# Altium footprint library SparkFun.PCBLIB: 674 footprints (part 40 of 44)
Each footprint in its own frame and in the unit in brackets; x right, y up, seen from the top. Pads: shape width x height; smd on the part's side, far side on the other; paste and mask are expansions set on the pad; w line width, h text height; cw(c..) or ccw(c..) is an arc to the next point about the centre after c.
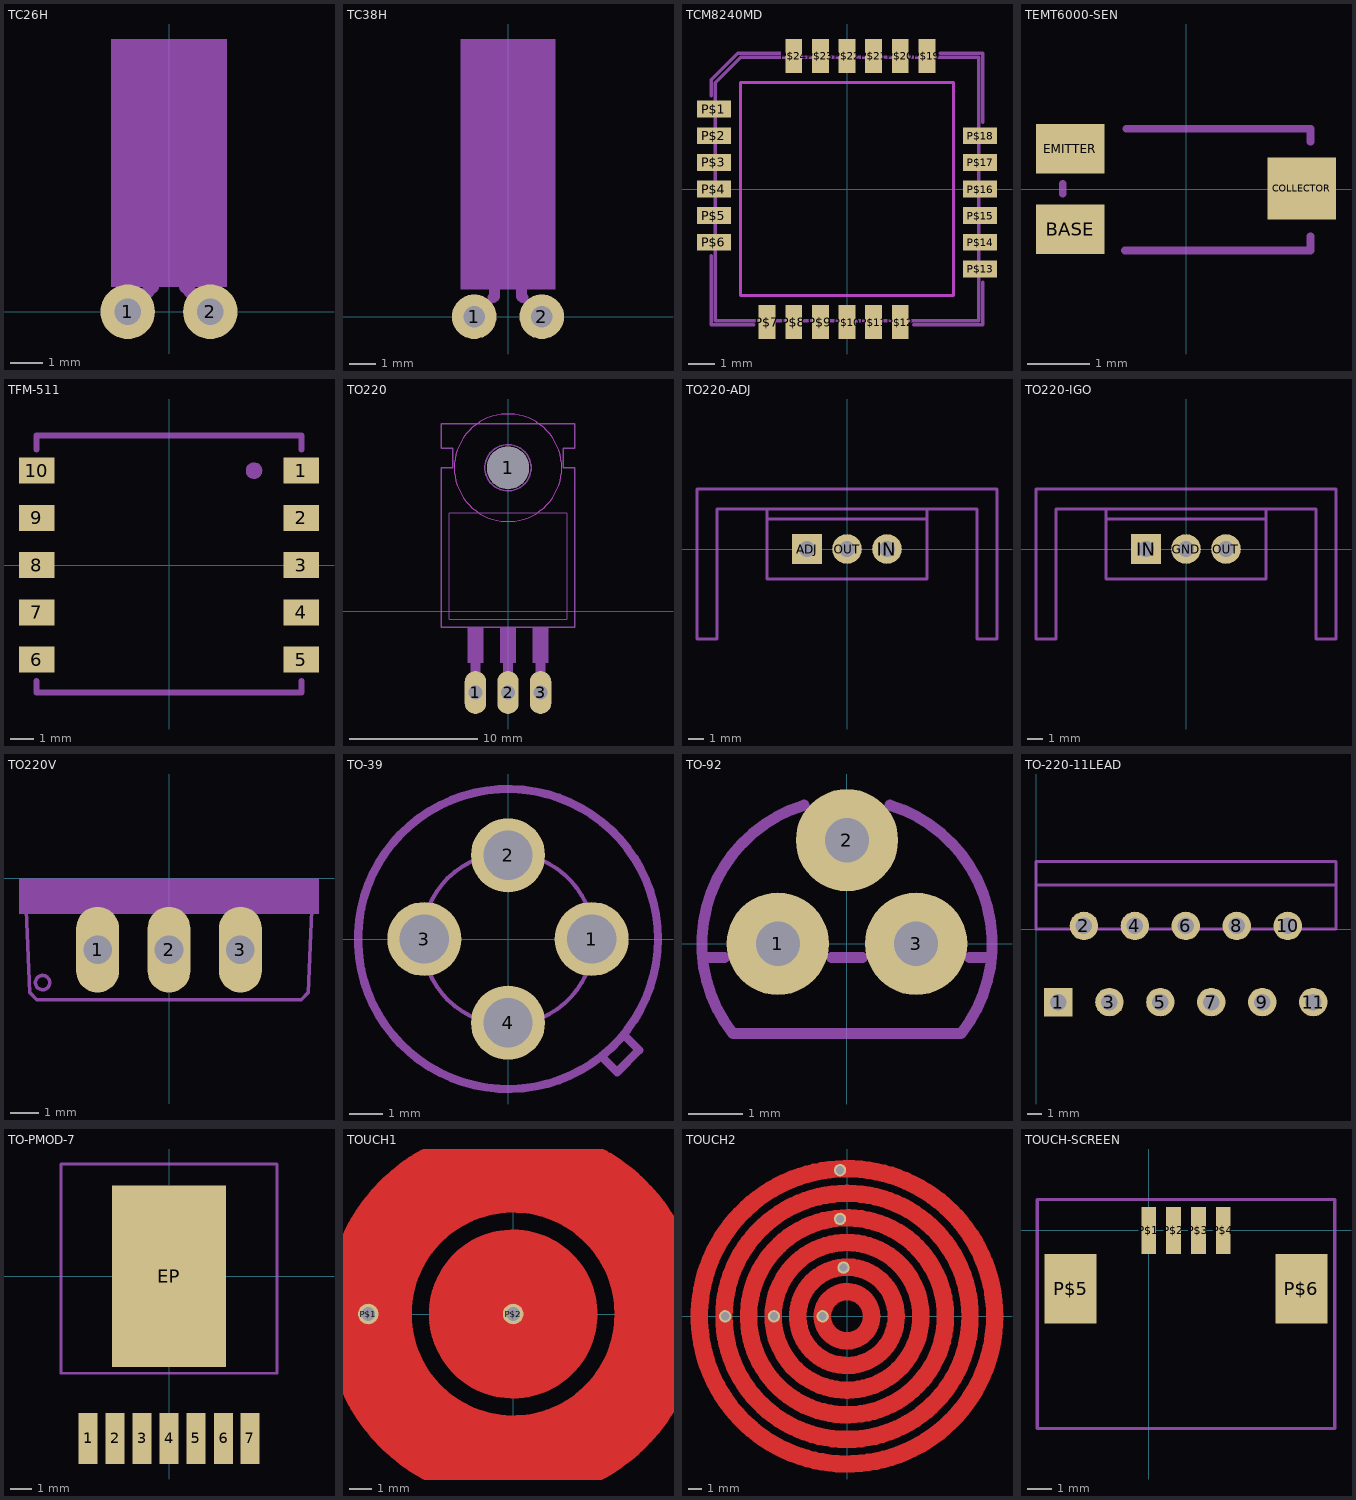
[diagram p39: the footprints below, top view; thin cyan lines are the x and y axes]

## TC26H [mil]
pads (2):
  round 66 hole 32: 1(-50,0) 2(50,0)
Mechanical 2:
  rectangle: 12,40 28,63
  rectangle: -28,40 -12,63
  lines w6: -20,165 0,165 ; -20,210 0,210 ; 0,145 0,165 ; 0,230 0,210 ; 20,165 0,165 ; 20,210 0,210 ; -35,80 -35,65 35,65 35,80 ; -35,80 -40,80 -40,295 cw(c-30,295) -30,305 30,305 cw(c30,295) 40,295 40,80 35,80 ; -35,80 35,80 ; -20,180 -20,195 20,195 20,180 -20,180
  lines w16: -20,30 -20,50 ; 20,30 20,45
Mechanical 12:
  rectangle: -70,30 70,330
Mechanical 18:
  lines w16: -50,0 -25,25 ; 25,25 50,0

## TC38H [mil]
pads (2):
  round 66 hole 32: 1(-50,0) 2(50,0)
Mechanical 2:
  rectangle: 12,40 28,63
  rectangle: -28,40 -12,63
  lines w6: -30,190 0,190 ; -30,235 0,235 ; 0,170 0,190 ; 0,255 0,235 ; 30,190 0,190 ; 30,235 0,235 ; -55,80 -55,65 55,65 55,80 ; -55,80 -60,80 -60,380 cw(c-50,380) -50,390 50,390 cw(c50,380) 60,380 60,80 55,80 ; -55,80 55,80 ; -30,205 -30,220 30,220 30,205 -30,205
  lines w16: -22,28 -20,30 -20,40 ; 20,45 20,30 22,28
Mechanical 12:
  rectangle: -70,40 70,410
Mechanical 18:
  lines w6: -50,0 -25,25 ; 25,25 50,0

## TCM8240MD [mm]
pads (24):
  rect 1.27x0.635 smd: P$1(-5,3) P$2(-5,2) P$3(-5,1) P$4(-5,0) P$5(-5,-1) P$6(-5,-2) P$13(5,-3) P$14(5,-2) P$15(5,-1) P$16(5,0) P$17(5,1) P$18(5,2)
  rect 0.635x1.27 smd: P$7(-3,-5) P$8(-2,-5) P$9(-1,-5) P$10(0,-5) P$11(1,-5) P$12(2,-5) P$19(3,5) P$20(2,5) P$21(1,5) P$22(0,5) P$23(-1,5) P$24(-2,5)
Keep-Out Layer:
  lines w0.127: -4,-4 4,-4 4,4 -4,4 -4,-4
Mechanical 2:
  lines w0.127: -5.1,-2.5 -5.1,-5.1 -3.5,-5.1 ; -5.1,3.5 -5.1,4.1 -4.1,5.1 -2.5,5.1 ; 2.5,-5.1 5.1,-5.1 5.1,-3.5 ; 3.5,5.1 5.1,5.1 5.1,2.5
Mechanical 10 keep-out:
  lines w0.127: -4,-4 4,-4 4,4 -4,4 -4,-4
Mechanical 18:
  lines w0.127: -4.95,-4.95 4.95,-4.95 4.95,4.95 -4,4.95 -4.95,4 -4.95,-4.95

## TEMT6000-SEN [mm]
pads (3):
  rect 1.1x0.8 smd: BASE(-1.87,-0.65) EMITTER(-1.87,0.65)
  rect 1.1x1 smd: COLLECTOR(1.86,0.01)
Mechanical 2:
  lines w0.127: -1.99,-0.07 -1.99,0.08 ; -0.99,-0.99 2,-0.99 2,-0.76 ; -0.96,0.97 2,0.97 2,0.76

## TFM-511 [mm]
pads (10):
  rect 1.5x1.1 smd: 1(5.6,4) 2(5.6,2) 3(5.6,0) 4(5.6,-2) 5(5.6,-4) 6(-5.6,-4) 7(-5.6,-2) 8(-5.6,0) 9(-5.6,2) 10(-5.6,4)
Mechanical 2:
  circle w0.254: c3.6,4 r0.141
  circle w0.254: c3.6,4 r0.224
  lines w0.127: -5.6,-5.4 -5.6,-5.3
  lines w0.254: -5.6,-5.4 5.6,-5.4 5.6,-4.9 ; -5.6,-5.3 -5.6,-4.9 ; -5.6,4.9 -5.6,5.5 5.6,5.5 5.6,4.9

## TO220 [mil]
pads (4):
  oval 66x132 hole 44: 1(-100,-250) 2(0,-250) 3(100,-250)
  round 130 hole 130: 1(0,440)
Mechanical 2:
  circle w5: c0,440 r71
  rectangle: 85,-185 115,-160
  rectangle: -15,-185 15,-160
  rectangle: -115,-185 -85,-160
  rectangle: -125,-160 -75,-50
  rectangle: -25,-160 25,-50
  rectangle: 75,-160 125,-50
  lines w2: -180,-25 180,-25 180,300 -180,300 -180,-25
  lines w5: -205,-50 205,-50 205,440 170,440 170,500 205,500 205,575 -205,575 -205,500 -170,500 -170,440 -205,440 -205,-50
Mechanical 11 keep-out:
  circle w0: c0,440 r165
Mechanical 12:
  circle w0: c0,440 r165
Mechanical 18:
  rectangle: -115,-260 -85,-185
  rectangle: -15,-260 15,-185
  rectangle: 85,-260 115,-185

## TO220-ADJ [mil]
pads (3):
  rect 74x74 hole 39.37: ADJ(-100,0)
  round 74 hole 39.37: IN(100,0) OUT(0,0)
Mechanical 2:
  lines w8: -200,75 -200,-75 200,-75 200,75 ; -200,75 -200,100 200,100 200,75 ; -200,75 200,75
Mechanical 18:
  lines w8: -200,100 -325,100 -325,-225 -375,-225 -375,150 375,150 375,-225 325,-225 325,100 200,100

## TO220-IGO [mil]
pads (3):
  round 74 hole 39.37: GND(0,0) OUT(100,0)
  rect 74x74 hole 39.37: IN(-100,0)
Mechanical 2:
  lines w8: -200,75 -200,-75 200,-75 200,75 ; -200,75 -200,100 200,100 200,75 ; -200,75 200,75
Mechanical 18:
  lines w8: -200,100 -325,100 -325,-225 -375,-225 -375,150 375,150 375,-225 325,-225 325,100 200,100

## TO220V [mil]
pads (3):
  oval 60x120 hole 40: 1(-100,-100) 2(0,-100) 3(100,-100)
Mechanical 2:
  circle w5: c-177,-146 r10
  rectangle: -210,-30 210,0
  rectangle: -210,-50 -135,-30
  rectangle: -65,-50 -35,-30
  rectangle: 35,-50 65,-30
  rectangle: 135,-50 210,-30
  lines w5: -200,-45 -195,-160 -185,-170 185,-170 195,-160 200,-45
Mechanical 18:
  rectangle: -135,-50 -65,-30
  rectangle: -35,-50 35,-30
  rectangle: 65,-50 135,-30

## TO-39 [mil]
pads (4):
  round 88.59 hole 59.06: 1(100,0) 2(0,100) 3(-100,0) 4(0,-100)
Mechanical 2:
  circle w10: c0,0 r179.3
  lines w10: 112.16,-141.15 128.87,-157.86 ; 130.26,-159.25 156.7,-132.8 ; 138.61,-114.71 155.31,-131.41
Mechanical 18:
  circle w5: c0,0 r102.36
  circle w5: c0,0 r179.13
  lines w5: 112.16,-141.15 128.87,-157.86 ; 130.26,-159.25 156.7,-132.8 ; 138.61,-114.71 155.31,-131.41

## TO-92 [mil]
pads (3):
  round 74 hole 32: 1(-50,0) 2(0,75) 3(50,0)
Mechanical 2:
  lines w8: -104.52,-10 -88.73,-10 ; -30.96,100.33 ccw(c0,0) -82.46,-65 82.46,-65 ccw(c0,0) 30.96,100.33 ; -11.27,-10 11.27,-10 ; 88.73,-10 104.52,-10

## TO-220-11LEAD [mm]
pads (11):
  rect 1.9x1.9 hole 1.1: 1(1.5,-4.87)
  round 1.9 hole 1.1: 2(3.2,0.21) 3(4.9,-4.87) 4(6.6,0.21) 5(8.3,-4.87) 6(10,0.21) 7(11.7,-4.87) 8(13.4,0.21) 9(15.1,-4.87) 10(16.8,0.21) 11(18.5,-4.87)
Mechanical 2:
  lines w0.203: 2.05,0 0,0 0,2.95 ; 4.35,0 5.45,0 ; 7.75,0 8.85,0 ; 11.15,0 12.25,0 ; 14.55,0 15.65,0 ; 17.95,0 20,0 ; 20.02,0 20.02,2.95 ; 0,2.95 0,4.5 20.02,4.5 20.02,2.95 ; 0,2.95 20.02,2.95
Mechanical 18:
  lines w0.203: 0,0 20.02,0

## TO-PMOD-7 [mm]
pads (8):
  rect 0.89x2.41 smd: 1(-3.81,-7.63) 2(-2.54,-7.63) 3(-1.27,-7.63) 4(0,-7.63) 5(1.27,-7.63) 6(2.57,-7.63) 7(3.81,-7.63)
  rect 5.35x8.54 smd: EP(0,0)
Mechanical 2:
  lines w0.127: -5.08,-4.57 -5.08,5.28 5.08,5.28 5.08,-4.57 -5.08,-4.57

## TOUCH1 [mil]
pads (2):
  round 35.43 hole 23.62: P$1(-250,0) P$2(0,0)
Top Layer:
  circle w150: c0,0 r70.71
  circle w150: c0,0 r250
  circle w150: c0,0 r70.71
  circle w150: c0,0 r250
Top Solder:
  circle w150: c0,0 r70.71
  circle w150: c0,0 r250
  circle w150: c0,0 r70.71
  circle w150: c0,0 r250

## TOUCH2 [mil]
pads (6):
  round 35.43 hole 23.62: P$1(-70,0) P$2(-210,0) P$3(-350,0) P$4(-10,140) P$5(-20,280) P$6(-20,420)
Top Layer:
  circle w50: c0,0 r70.71
  circle w50: c0,0 r282.84
  circle w50: c0,0 r353.55
  circle w50: c0,0 r424.26
  circle w50: c0,0 r141.42
  circle w50: c0,0 r212.13
Top Solder:
  circle w50: c0,0 r141.42
  circle w50: c0,0 r212.13
  circle w50: c0,0 r282.84
  circle w50: c0,0 r353.55
  circle w50: c0,0 r424.26
  circle w50: c0,0 r70.71

## TOUCH-SCREEN [mm]
pads (6):
  rect 0.6x1.9 smd: P$1(0,0) P$2(1,0) P$3(2,0) P$4(3,0)
  rect 2.1x2.8 smd: P$5(-3.15,-2.35) P$6(6.15,-2.35)
Mechanical 2:
  lines w0.127: -4.5,-8 7.5,-8 7.5,1.25 -4.5,1.25 -4.5,-8